# Altium footprint library Library.PcbLib: 292 footprints (part 11 of 20)
Each footprint in its own frame and in the unit in brackets; x right, y up, seen from the top. Pads: shape width x height; smd on the part's side, far side on the other; paste and mask are expansions set on the pad; w line width, h text height; cw(c..) or ccw(c..) is an arc to the next point about the centre after c.
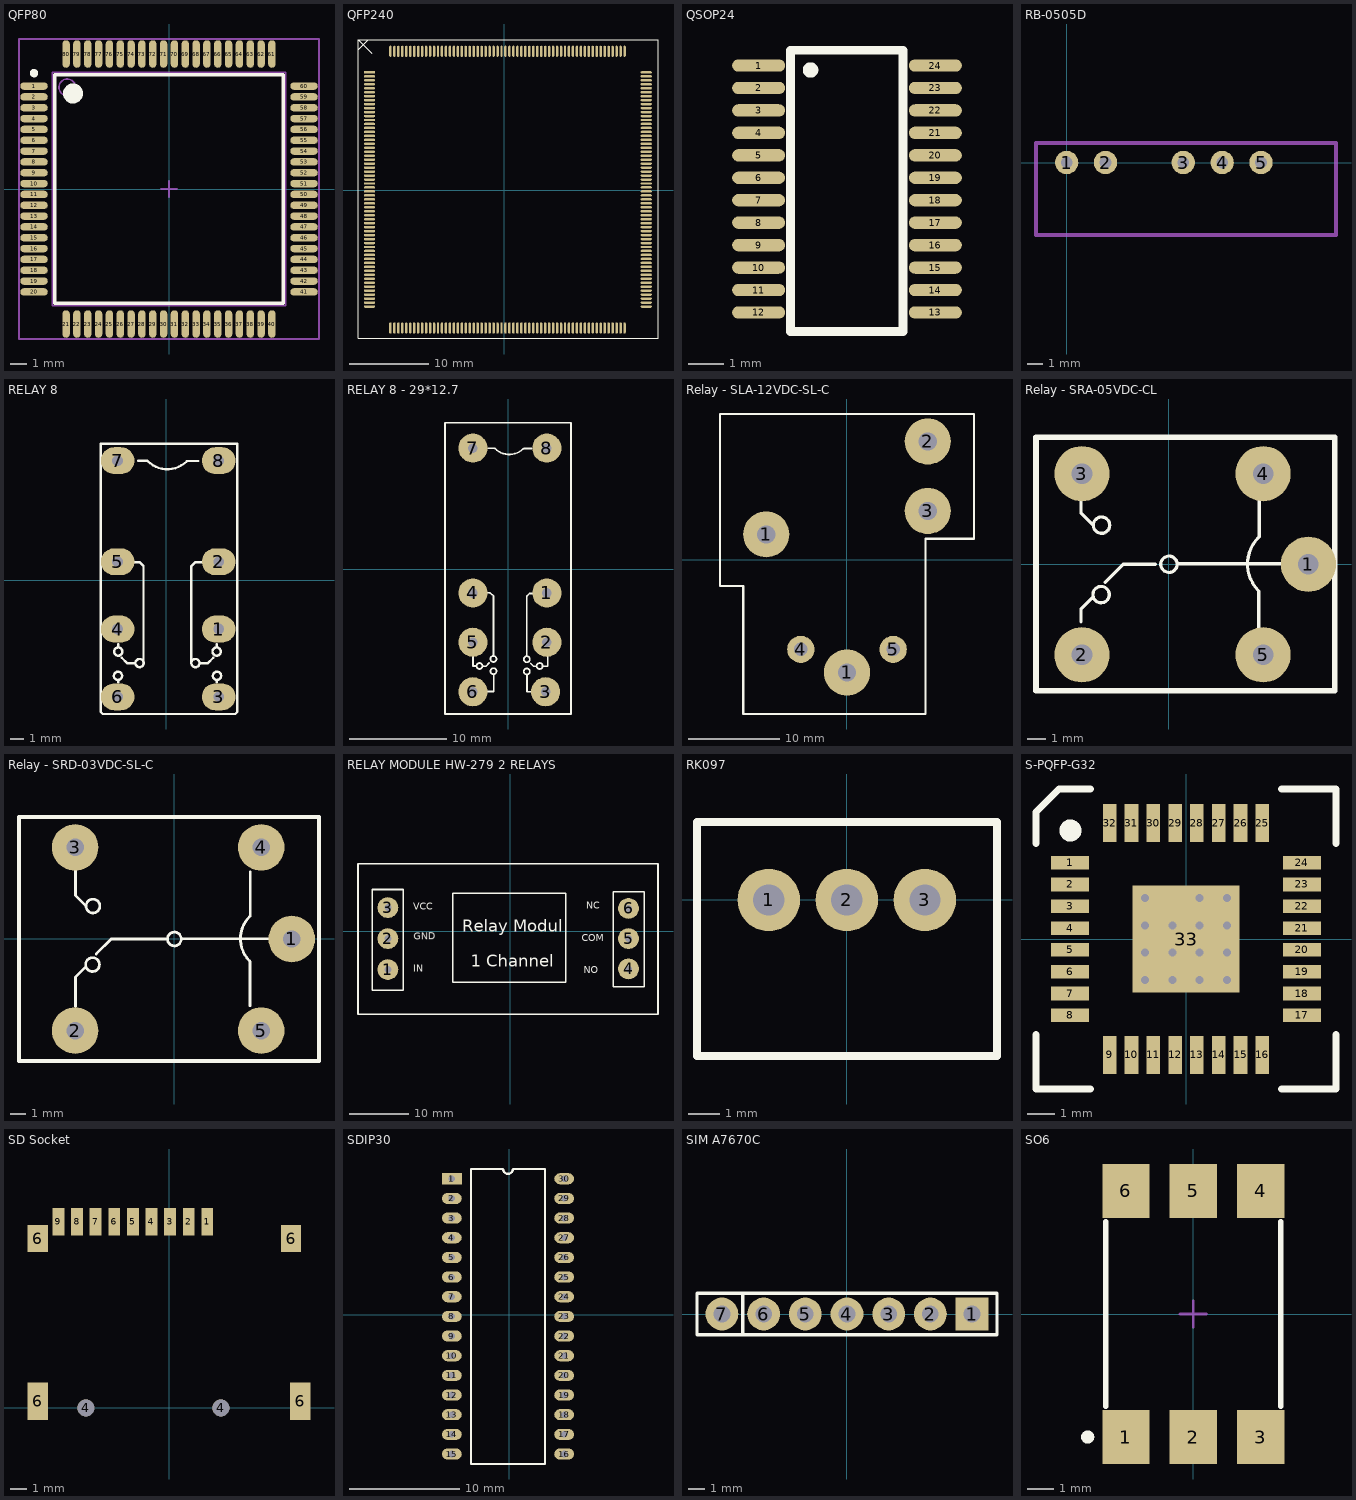
[diagram p10: the footprints below, top view; thin cyan lines are the x and y axes]

## QFP80 [mm] "QFP, 80-Leads, Body 14 x 14mm, Pitch 0.65mm, IPC High Density"
height 2.45
pads (80):
  oval 1.65x0.45 smd: 1(-8.1,6.175) 2(-8.1,5.525) 3(-8.1,4.875) 4(-8.1,4.225) 5(-8.1,3.575) 6(-8.1,2.925) 7(-8.1,2.275) 8(-8.1,1.625) 9(-8.1,0.975) 10(-8.1,0.325) 11(-8.1,-0.325) 12(-8.1,-0.975) 13(-8.1,-1.625) 14(-8.1,-2.275) 15(-8.1,-2.925) 16(-8.1,-3.575) 17(-8.1,-4.225) 18(-8.1,-4.875) 19(-8.1,-5.525) 20(-8.1,-6.175) 41(8.1,-6.175) 42(8.1,-5.525) 43(8.1,-4.875) 44(8.1,-4.225) 45(8.1,-3.575) 46(8.1,-2.925) 47(8.1,-2.275) 48(8.1,-1.625) 49(8.1,-0.975) 50(8.1,-0.325) 51(8.1,0.325) 52(8.1,0.975) 53(8.1,1.625) 54(8.1,2.275) 55(8.1,2.925) 56(8.1,3.575) 57(8.1,4.225) 58(8.1,4.875) 59(8.1,5.525) 60(8.1,6.175)
  oval 0.45x1.65 smd: 21(-6.175,-8.1) 22(-5.525,-8.1) 23(-4.875,-8.1) 24(-4.225,-8.1) 25(-3.575,-8.1) 26(-2.925,-8.1) 27(-2.275,-8.1) 28(-1.625,-8.1) 29(-0.975,-8.1) 30(-0.325,-8.1) 31(0.325,-8.1) 32(0.975,-8.1) 33(1.625,-8.1) 34(2.275,-8.1) 35(2.925,-8.1) 36(3.575,-8.1) 37(4.225,-8.1) 38(4.875,-8.1) 39(5.525,-8.1) 40(6.175,-8.1) 61(6.175,8.1) 62(5.525,8.1) 63(4.875,8.1) 64(4.225,8.1) 65(3.575,8.1) 66(2.925,8.1) 67(2.275,8.1) 68(1.625,8.1) 69(0.975,8.1) 70(0.325,8.1) 71(-0.325,8.1) 72(-0.975,8.1) 73(-1.625,8.1) 74(-2.275,8.1) 75(-2.925,8.1) 76(-3.575,8.1) 77(-4.225,8.1) 78(-4.875,8.1) 79(-5.525,8.1) 80(-6.175,8.1)
Top Overlay:
  circle w0.6: c-5.762,5.731 r0.3
  circle w0.25: c-8.1,6.95 r0.125
  lines w0.2: -6.85,-6.85 6.85,-6.85 6.85,6.85 -6.85,6.85 -6.85,-6.85
Mechanical 13:
  circle w0.1: c-6.1,6.1 r0.5
  lines w0.1: -7,-7 7,-7 7,7 -7,7 -7,-7
Mechanical 15:
  lines w0.1: -0.5,0 0.5,0 ; 0,-0.5 0,0.5 ; -9,-9 9,-9 9,9 -9,9 -9,-9
3D body "User Library-IPC QFP-full.step": height 1.35, standoff 0, extent -8.018,-8.018 8.018,8.018

## QFP240 [mm]
pads (240):
  rect 1.4x0.31 smd: 1(-16.993,14.859)
  oval 1.4x0.31 smd: 2(-16.993,14.359) 3(-16.993,13.859) 4(-16.993,13.359) 5(-16.993,12.859) 6(-16.993,12.359) 7(-16.993,11.859) 8(-16.993,11.359) 9(-16.993,10.859) 10(-16.993,10.359) 11(-16.993,9.859) 12(-16.993,9.359) 13(-16.993,8.859) 14(-16.993,8.359) 15(-16.993,7.859) 16(-16.993,7.359) 17(-16.993,6.859) 18(-16.993,6.359) 19(-16.993,5.859) 20(-16.993,5.359) 21(-16.993,4.859) 22(-16.993,4.359) 23(-16.993,3.859) 24(-16.993,3.359) 25(-16.993,2.859) 26(-16.993,2.359) 27(-16.993,1.859) 28(-16.993,1.359) 29(-16.993,0.859) 30(-16.993,0.359) 31(-16.993,-0.141) 32(-16.993,-0.641) 33(-16.993,-1.141) 34(-16.993,-1.641) 35(-16.993,-2.141) 36(-16.993,-2.641) 37(-16.993,-3.141) 38(-16.993,-3.641) 39(-16.993,-4.141) 40(-16.993,-4.641) 41(-16.993,-5.141) 42(-16.993,-5.641) 43(-16.993,-6.141) 44(-16.993,-6.641) 45(-16.993,-7.141) 46(-16.993,-7.641) 47(-16.993,-8.141) 48(-16.993,-8.641) 49(-16.993,-9.141) 50(-16.993,-9.641) 51(-16.993,-10.141) 52(-16.993,-10.641) 53(-16.993,-11.141) 54(-16.993,-11.641) 55(-16.993,-12.141) 56(-16.993,-12.641) 57(-16.993,-13.141) 58(-16.993,-13.641) 59(-16.993,-14.141) 60(-16.993,-14.641) 121(17.872,-14.641) 122(17.872,-14.141) 123(17.872,-13.641) 124(17.872,-13.141) 125(17.872,-12.641) 126(17.872,-12.141) 127(17.872,-11.641) 128(17.872,-11.141) 129(17.872,-10.641) 130(17.872,-10.141) 131(17.872,-9.641) 132(17.872,-9.141) 133(17.872,-8.641) 134(17.872,-8.141) 135(17.872,-7.641) 136(17.872,-7.141) 137(17.872,-6.641) 138(17.872,-6.141) 139(17.872,-5.641) 140(17.872,-5.141) 141(17.872,-4.641) 142(17.872,-4.141) 143(17.872,-3.641) 144(17.872,-3.141) 145(17.872,-2.641) 146(17.872,-2.141) 147(17.872,-1.641) 148(17.872,-1.141) 149(17.872,-0.641) 150(17.872,-0.141) 151(17.872,0.359) 152(17.872,0.859) 153(17.872,1.359) 154(17.872,1.859) 155(17.872,2.359) 156(17.872,2.859) 157(17.872,3.359) 158(17.872,3.859) 159(17.872,4.359) 160(17.872,4.859) 161(17.872,5.359) 162(17.872,5.859) 163(17.872,6.359) 164(17.872,6.859) 165(17.872,7.359) 166(17.872,7.859) 167(17.872,8.359) 168(17.872,8.859) 169(17.872,9.359) 170(17.872,9.859) 171(17.872,10.359) 172(17.872,10.859) 173(17.872,11.359) 174(17.872,11.859) 175(17.872,12.359) 176(17.872,12.859) 177(17.872,13.359) 178(17.872,13.859) 179(17.872,14.359) 180(17.872,14.859)
  oval 0.31x1.4 smd: 61(-14.361,-17.349) 62(-13.861,-17.349) 63(-13.361,-17.349) 64(-12.861,-17.349) 65(-12.361,-17.349) 66(-11.861,-17.349) 67(-11.361,-17.349) 68(-10.861,-17.349) 69(-10.361,-17.349) 70(-9.861,-17.349) 71(-9.361,-17.349) 72(-8.861,-17.349) 73(-8.361,-17.349) 74(-7.861,-17.349) 75(-7.361,-17.349) 76(-6.861,-17.349) 77(-6.361,-17.349) 78(-5.861,-17.349) 79(-5.361,-17.349) 80(-4.861,-17.349) 81(-4.361,-17.349) 82(-3.861,-17.349) 83(-3.361,-17.349) 84(-2.861,-17.349) 85(-2.361,-17.349) 86(-1.861,-17.349) 87(-1.361,-17.349) 88(-0.861,-17.349) 89(-0.361,-17.349) 90(0.139,-17.349) 91(0.639,-17.349) 92(1.139,-17.349) 93(1.639,-17.349) 94(2.139,-17.349) 95(2.639,-17.349) 96(3.139,-17.349) 97(3.639,-17.349) 98(4.139,-17.349) 99(4.639,-17.349) 100(5.139,-17.349) 101(5.639,-17.349) 102(6.139,-17.349) 103(6.639,-17.349) 104(7.139,-17.349) 105(7.639,-17.349) 106(8.139,-17.349) 107(8.639,-17.349) 108(9.139,-17.349) 109(9.639,-17.349) 110(10.139,-17.349) 111(10.639,-17.349) 112(11.139,-17.349) 113(11.639,-17.349) 114(12.139,-17.349) 115(12.639,-17.349) 116(13.139,-17.349) 117(13.639,-17.349) 118(14.139,-17.349) 119(14.639,-17.349) 120(15.139,-17.349) 181(15.139,17.516) 182(14.639,17.516) 183(14.139,17.516) 184(13.639,17.516) 185(13.139,17.516) 186(12.639,17.516) 187(12.139,17.516) 188(11.639,17.516) 189(11.139,17.516) 190(10.639,17.516) 191(10.139,17.516) 192(9.639,17.516) 193(9.139,17.516) 194(8.639,17.516) 195(8.139,17.516) 196(7.639,17.516) 197(7.139,17.516) 198(6.639,17.516) 199(6.139,17.516) 200(5.639,17.516) 201(5.139,17.516) 202(4.639,17.516) 203(4.139,17.516) 204(3.639,17.516) 205(3.139,17.516) 206(2.639,17.516) 207(2.139,17.516) 208(1.639,17.516) 209(1.139,17.516) 210(0.639,17.516) 211(0.139,17.516) 212(-0.361,17.516) 213(-0.861,17.516) 214(-1.361,17.516) 215(-1.861,17.516) 216(-2.361,17.516) 217(-2.861,17.516) 218(-3.361,17.516) 219(-3.861,17.516) 220(-4.361,17.516) 221(-4.861,17.516) 222(-5.361,17.516) 223(-5.861,17.516) 224(-6.361,17.516) 225(-6.861,17.516) 226(-7.361,17.516) 227(-7.861,17.516) 228(-8.361,17.516) 229(-8.861,17.516) 230(-9.361,17.516) 231(-9.861,17.516) 232(-10.361,17.516) 233(-10.861,17.516) 234(-11.361,17.516) 235(-11.861,17.516) 236(-12.361,17.516) 237(-12.861,17.516) 238(-13.361,17.516) 239(-13.861,17.516) 240(-14.361,17.516)
Top Overlay:
  lines w0.127: -18.44,17.145 -18.44,17.678 -17.145,18.974 ; -16.739,17.272 -18.44,18.974 ; -18.44,18.974 -18.44,-18.644 19.355,-18.644 19.355,18.974 -18.44,18.974
3D body "User Library-QFP240.step": height 4, standoff 0, extent -16.891,-17.145 17.709,17.455

## QSOP24 [mm]
pads (24):
  oval 1.5x0.35 smd: 1(3.306,109.982) 2(3.306,109.347) 3(3.306,108.712) 4(3.306,108.077) 5(3.306,107.442) 6(3.306,106.807) 7(3.306,106.172) 8(3.306,105.537) 9(3.306,104.902) 10(3.306,104.267) 11(3.306,103.632) 12(3.306,102.997) 13(8.306,102.997) 14(8.306,103.632) 15(8.306,104.267) 16(8.306,104.902) 17(8.306,105.537) 18(8.306,106.172) 19(8.306,106.807) 20(8.306,107.442) 21(8.306,108.077) 22(8.306,108.712) 23(8.306,109.347) 24(8.306,109.982)
Top Overlay:
  circle w0.254: c4.775,109.855 r0.092
  lines w0.254: 4.205,102.464 4.205,110.414 7.391,110.414 7.391,102.464 4.205,102.464
Mechanical 1:

## RB-0505D [mil]
pads (5):
  round 60 hole 30: 1(0,0) 2(100,0) 3(300,0) 4(400,0) 5(500,0)
Mechanical 1:
  lines w10: -78.74,-186.22 692.91,-186.22 692.91,50 -78.74,50 -78.74,-186.22
3D body "rb-0505d.stp": height 407.28, standoff -115.55, extent -78.74,-186.22 692.91,50

## RELAY 8 [mil] "Small"
pads (8):
  oval 100x80 hole 32: 1(155,-145) 2(155,55) 3(155,-346) 4(-145,-145) 5(-145,55) 6(-145,-346) 7(-145,355) 8(155,355)
Top Overlay:
  circle w7: c-144,-283.76 r12.24
  circle w7: c-143,-211.76 r12.24
  circle w7: c-80,-245.76 r12.24
  circle w7: c86,-245.76 r12.24
  circle w7: c149,-211.76 r12.24
  circle w7: c150,-283.76 r12.24
  lines w7: -143,-303 -143,-298 ; -143,-197 -143,-189 ; -133,-230 -117,-246 -94,-246 ; -100,53 -79,53 -68,42 -68,-244 ; -84,355 -57,355 ; -56,354 ccw(c2.5,411.5) 60,353 ; 61,354 94,354 ; 74,-244 74,42 85,53 113,53 ; 100,-246 123,-246 139,-230 ; 149,-303 149,-298 ; 149,-197 149,-189 ; -195,-391 -195,405 210,405 210,-391 204,-397 -189,-397 -195,-391
3D body "SW3dPS-DSY2Y.STEP": height 484.25, standoff -118.11, extent -185,-404.45 200.83,414.45

## RELAY 8 - 29*12.7 [mm]
pads (8):
  round 3 hole 1: 1(4,-2.42) 2(4,-7.5) 3(3.88,-12.605) 4(-3.62,-2.42) 5(-3.62,-7.5) 6(-3.62,-12.605) 7(-3.62,12.5) 8(4,12.5)
Top Overlay:
  circle w0.178: c-1.498,-10.479 r0.311
  circle w0.178: c-2.937,-9.948 r0.311
  circle w0.178: c-1.499,-9.221 r0.311
  circle w0.178: c3.26,-9.948 r0.311
  circle w0.178: c1.943,-10.51 r0.311
  circle w0.178: c1.943,-9.252 r0.311
  lines w0.178: -3.62,-2.42 -1.889,-2.388 -1.499,-2.718 -1.499,-8.911 ; -3.611,-8.136 -3.611,-9.949 -3.247,-9.949 ; -3.569,-11.513 -3.569,-11.386 ; -3.569,-8.82 -3.569,-8.617 ; -3.389,-12.574 -1.475,-12.574 -1.475,-10.789 ; -2.541,-9.961 -2.267,-9.961 -1.927,-9.621 ; -2.071,12.5 -1.385,12.5 ; -1.359,12.475 ccw(c0.126,13.935) 1.587,12.449 ; 1.612,12.475 2.451,12.475 ; 1.943,-8.942 1.943,-2.75 2.222,-2.47 2.933,-2.47 ; 1.966,-10.82 1.966,-12.605 3.88,-12.605 ; 2.34,-9.696 2.626,-9.982 2.951,-9.982 ; 3.585,-9.962 4.106,-9.962 4.106,-8.39 ; 3.848,-11.513 3.848,-11.386 ; 3.848,-8.82 3.848,-8.617 ; -6.5,-14.893 -6.5,15.107 6.5,15.107 6.5,-14.893 -6.5,-14.893
  lines w0.254: -3.611,-8.136 -3.55,-8.136
3D body "User Library-Relay 24VDC 8Pin.STEP": height 15.95, standoff -3.45, extent -6.204,-14.084 6.496,14.916

## Relay - SLA-12VDC-SL-C [mm]
pads (6):
  round 5.08 / inner round 0 / far side round 5.08 hole 2: 1(-8.877,2.773) 1(0.013,-12.427) 2(8.903,13.003) 3(8.903,5.353)
  round 3 / inner round 0 / far side round 3 hole 1.5: 4(-5.067,-9.887) 5(5.093,-9.887)
Top Overlay:
  lines w0.254: -13.957,-2.902 -13.957,16.021 13.983,16.021 13.983,2.305 10.681,2.305 8.649,2.305 8.649,-16.999 -11.417,-16.999 -11.417,-2.902 -13.957,-2.902
3D body "User Library-Releu Songle.step": height 20.26, standoff -3.8, extent -13.5,-16.3 13.5,15.7

## Relay - SRA-05VDC-CL [mil] "15.5 x 12.3 x 14mm"
height 551.18
pads (5):
  round 120 hole 45: 1(302.94,0) 2(-189.15,-196.85) 3(-189.15,196.85) 4(204.52,196.85) 5(204.52,-196.85)
Top Overlay:
  circle w7: c0,0 r17.8
  circle w7: c-147.58,-66 r17.8
  circle w7: c-146.58,85 r17.8
  lines w7: -191.38,-125 -191.38,-98 -165.38,-72 ; -191.38,136.83 -191.38,112 -164.38,85 ; -138.38,-39 -99.38,0 -30,0 ; 20.2,1 253.2,1 ; 194.2,-57 cw(c252.7,0.5) 195.2,59 ; 195.2,-172 195.2,-58 ; 196.2,60 196.2,173
  lines w12: -289.03,-275 360.52,-275 360.52,276.13 -289.03,276.13 -289.03,-275
3D body "Relay - SRA-05VDC-CL.stp": height 102.93, standoff -627.47, extent -274.7,-236 338.3,236

## Relay - SRD-03VDC-SL-C [mil] "19.1 x 15.5 x 15.3mm"
height 602.36
pads (5):
  round 120 hole 45: 1(302.94,0) 2(-256.12,-236.22) 3(-256.12,236.22) 4(224.2,236.22) 5(224.2,-236.22)
Top Overlay:
  circle w7: c-210,85 r17.8
  circle w7: c-211,-66 r17.8
  circle w7: c0,0 r17.8
  lines w7: -254.8,-174 -254.8,-98 -228.8,-72 ; -254.8,178 -254.8,112 -227.8,85 ; -201.8,-39 -162.8,0 -19.8,0 ; 20.2,1 253.2,1 ; 194.2,-57 cw(c252.7,0.5) 195.2,59 ; 195.2,-172 195.2,-58 ; 196.2,60 196.2,173
  lines w10: -400.8,-314.96 373.21,-314.96 373.21,314.96 -400.8,314.96 -400.8,-314.96
3D body "Relay - SRD-03VDC-SL-C.stp": height 588.1, standoff -142.3, extent -384.55,-297 351.45,297

## RELAY MODULE HW-279 2 RELAYS [mm]
pads (6):
  round 3.5 hole 1.2: 1(-20.573,-6.473) 2(-20.573,-1.266) 3(-20.573,3.941) 4(19.876,-6.346) 5(19.876,-1.266) 6(19.876,3.814)
Top Overlay:
  lines w0.254: -25.59,-13.966 24.829,-13.966 24.829,11.307 -25.59,11.307 -25.59,-13.966 ; -23.177,-9.902 -17.97,-9.902 -17.97,6.989 -23.177,6.989 -23.177,-9.902 ; -9.69,-8.639 9.31,-8.639 9.31,6.361 -9.69,6.361 -9.69,-8.639 ; 17.336,-9.394 22.543,-9.394 22.543,6.608 17.336,6.608 17.336,-9.394
  text "COM" at 12.002,-2.154 h2.03
  text "NC" at 12.764,3.307 h2.03
  text "NO" at 12.383,-7.488 h2.03
  text "Relay Modul" at -8.064,-0.123 h2.03
  text "1 Channel" at -6.667,-5.965 h2.03
  text "GND" at -16.26,-1.9 h2.03
  text "VCC" at -16.281,3.18 h2.03
  text "IN" at -16.283,-7.278 h2.03
3D body "5v relay.SLDPRT": height 17, standoff -2.19, extent -25.59,-13.993 25.19,11.307

## RK097 [mm]
pads (3):
  round 2 hole 1: 1(-2.5,0) 2(0,0) 3(2.5,0)
Top Overlay:
  lines w0.254: -4.8,-5 4.81,-5 4.81,2.5 -4.8,2.5 -4.8,-5
3D body "RD901F-20-15R1.stp": height 11.3, standoff -3.5, extent -4.8,-19.8 4.8,2.5

## S-PQFP-G32 [mm]
pads (33):
  rect 1.4x0.5 smd mask+0.07: 1(-4.25,2.8) 2(-4.25,2) 3(-4.25,1.2) 4(-4.25,0.4) 5(-4.25,-0.4) 6(-4.25,-1.2) 7(-4.25,-2) 8(-4.25,-2.8) 17(4.25,-2.8) 18(4.25,-2) 19(4.25,-1.2) 20(4.25,-0.4) 21(4.25,0.4) 22(4.25,1.2) 23(4.25,2) 24(4.25,2.8)
  rect 0.5x1.4 smd mask+0.07: 9(-2.8,-4.25) 10(-2,-4.25) 11(-1.2,-4.25) 12(-0.4,-4.25) 13(0.4,-4.25) 14(1.2,-4.25) 15(2,-4.25) 16(2.8,-4.25) 25(2.8,4.25) 26(2,4.25) 27(1.2,4.25) 28(0.4,4.25) 29(-0.4,4.25) 30(-1.2,4.25) 31(-2,4.25) 32(-2.8,4.25)
  rect 3.91x3.91 smd mask+0.07: 33(0,0)
via 0.5,1.5 diameter 0.4 hole 0.3
via 0.5,0.5 diameter 0.4 hole 0.3
via 0.5,-0.5 diameter 0.4 hole 0.3
via 0.5,-1.5 diameter 0.4 hole 0.3
via -0.5,0.5 diameter 0.4 hole 0.3
via -0.5,-0.5 diameter 0.4 hole 0.3
via -0.5,-1.5 diameter 0.4 hole 0.3
via 1.5,-0.5 diameter 0.4 hole 0.3
via 1.5,0.5 diameter 0.4 hole 0.3
via 1.5,1.5 diameter 0.4 hole 0.3
via 1.5,-1.5 diameter 0.4 hole 0.3
via -1.5,0.5 diameter 0.4 hole 0.3
via -1.5,-0.5 diameter 0.4 hole 0.3
via -1.5,-1.5 diameter 0.4 hole 0.3
via -1.5,1.5 diameter 0.4 hole 0.3
Top Overlay:
  circle w0.4: c-4.238,3.977 r0.205
  lines w0.254: -5.5,-3.5 -5.5,-5.5 -3.5,-5.5 ; -5.5,3.5 -5.5,4.66 -4.66,5.5 -3.5,5.5 ; 3.5,-5.5 5.5,-5.5 5.5,-3.5 ; 3.5,5.5 5.5,5.5 5.5,3.5
3D body "DRV593VFPR.step": height 1.6, standoff 0, extent -4.5,-4.5 4.5,4.5

## SD Socket [mm]
pads (15):
  rect 0.7x1.6 smd: 1(2.25,11) 2(1.15,11) 3(0.05,11) 4(-1.05,11) 5(-2.15,11) 6(-3.25,11) 7(-4.35,11) 8(-5.45,11) 9(-6.55,11)
  round 1 hole 1: 4(-4.93,0) 4(3.05,0)
  rect 1.2x2.2 smd: 6(-7.78,0.4) 6(7.75,0.4)
  rect 1.2x1.6 smd: 6(-7.78,10) 6(7.2,10)
3D body "xb-xktf-n02-n.stp": height 1.85, standoff -0.6, extent -8.07,-4 8.069,11.194
3D body "User Library-microsd card.step": height 1.7, standoff 0.7, extent -6.584,-20.966 4.428,-5.966

## SDIP30 [mm]
pads (30):
  rect 1.8x1 hole 0.6: 1(-5.207,12.319)
  oval 1.8x1 hole 0.6: 2(-5.207,10.541) 3(-5.207,8.763) 4(-5.207,6.985) 5(-5.207,5.207) 6(-5.207,3.429) 7(-5.207,1.651) 8(-5.207,-0.127) 9(-5.207,-1.905) 10(-5.207,-3.683) 11(-5.207,-5.461) 12(-5.207,-7.239) 13(-5.207,-9.017) 14(-5.207,-10.795) 15(-5.207,-12.573) 16(4.953,-12.573) 17(4.953,-10.795) 18(4.953,-9.017) 19(4.953,-7.239) 20(4.953,-5.461) 21(4.953,-3.683) 22(4.953,-1.905) 23(4.953,-0.127) 24(4.953,1.651) 25(4.953,3.429) 26(4.953,5.207) 27(4.953,6.985) 28(4.953,8.763) 29(4.953,10.541) 30(4.953,12.319)
Top Overlay:
  lines w0.2: -3.472,-13.462 -3.472,13.208 -0.572,13.208 ccw(c-0.127,13.208) 0.318,13.208 3.218,13.208 3.218,-13.462 -3.472,-13.462
3D body "User Library-ul7aajr_sdip30.STEP": height 4.2, standoff -3.26, extent -5.34,-14.097 5.08,13.843

## SIM A7670C [mm]
pads (7):
  rect 2x2 hole 1.02: 1(7.62,0)
  round 2 hole 1.02: 2(5.08,0) 3(2.54,0) 4(0,0) 5(-2.54,0) 6(-5.08,0) 7(-7.62,0)
Top Overlay:
  lines w0.2: -6.35,-1.27 -6.35,1.27 ; -9.14,-1.27 9.14,-1.27 9.14,1.27 -9.14,1.27 -9.14,-1.27
3D body "SIM.step": height 15.52, standoff 1.57, extent -12.9,-1.4 13.1,26.6
3D body "61300711821.stp": height 8.51, standoff -3.09, extent -9.14,-1.25 9.14,1.25

## SO6 [mil]
height 200
pads (6):
  rect 70x80 smd: 1(-100,-182.48) 2(0,-182.48) 3(100,-182.48) 5(0,182.48) 6(-100,182.48)
  rect 70x80 smd mask+0: 4(100,182.48)
Top Overlay:
  circle w9.84: c-156.69,-182.48 r4.92
  lines w7.87: -129.92,-136.81 -129.92,136.81 ; 129.92,-136.81 129.92,136.81
Mechanical 15:
  lines w3.94: -19.69,0 19.68,0 ; 0,-19.68 0,19.68
3D body "PC900.stp": height 140.63, standoff 0.14, extent -138.06,-212.03 138.5,211.43